# Altium footprint library Global Library.PcbLib: 97 footprints (part 7 of 7)
Each footprint in its own frame and in the unit in brackets; x right, y up, seen from the top. Pads: shape width x height; smd on the part's side, far side on the other; paste and mask are expansions set on the pad; w line width, h text height; cw(c..) or ccw(c..) is an arc to the next point about the centre after c.
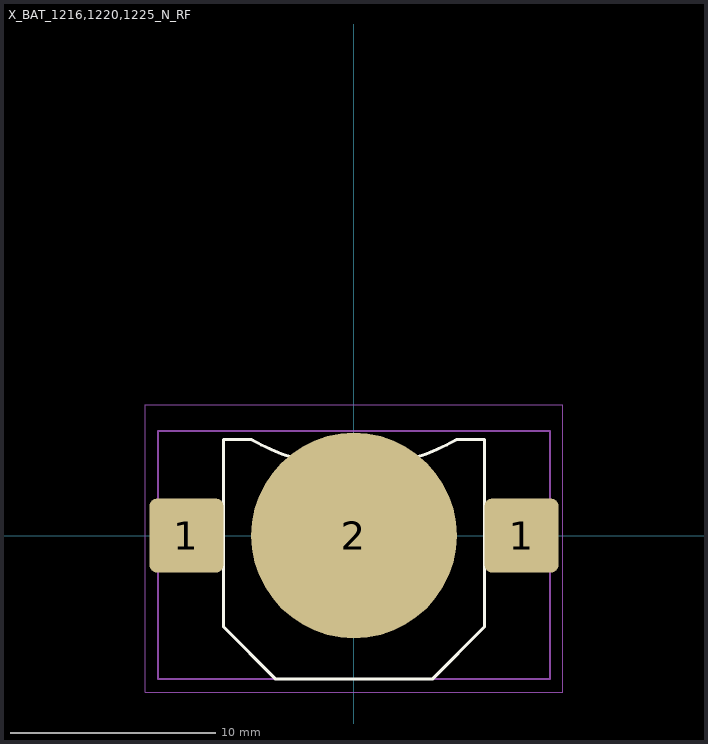
[diagram p6: the footprint, top view; thin cyan lines are the x and y axes]

## X_BAT_1216,1220,1225_N_RF [mm] "Battery Holder 1216, 1220, 1225"
height 2.2
pads (3):
  rrect20% 3.6x3.6 smd: 1(-8.15,0) 1(8.15,0)
  round 10 smd paste-10: 2(0,0)
Top Overlay:
  lines w0.15: -6.35,-4.445 -6.35,4.675 -5,4.675 ccw(c0,13.335) 5,4.675 6.35,4.675 6.35,-4.445 3.81,-6.985 -3.81,-6.985 -6.35,-4.445
Top Courtyard:
  lines w0.01: -10.16,-7.62 10.16,-7.62 10.16,6.35 -10.16,6.35 -10.16,-7.62
Top Assembly:
  lines w0.1: -9.525,-6.985 -9.525,5.08 9.525,5.08 9.525,-6.985 -9.525,-6.985
Top Assy SMT:
  lines w0.1: -9.525,-6.985 9.525,-6.985 9.525,5.08 -9.525,5.08 -9.525,-6.985
  text ".Designator" at -8.89,6.35 h1
3D body "User Library-CR1216.STEP": height 1.6, standoff 0, extent -6.2,-6.2 6.2,6.2
3D body "keystone-PN3000TR.STEP": height 3.15, standoff -0.02, extent -9.474,-6.921 9.474,5.143